# Altium footprint library MinervaBots.PcbLib: 162 footprints (part 4 of 11)
Each footprint in its own frame and in the unit in brackets; x right, y up, seen from the top. Pads: shape width x height; smd on the part's side, far side on the other; paste and mask are expansions set on the pad; w line width, h text height; cw(c..) or ccw(c..) is an arc to the next point about the centre after c.
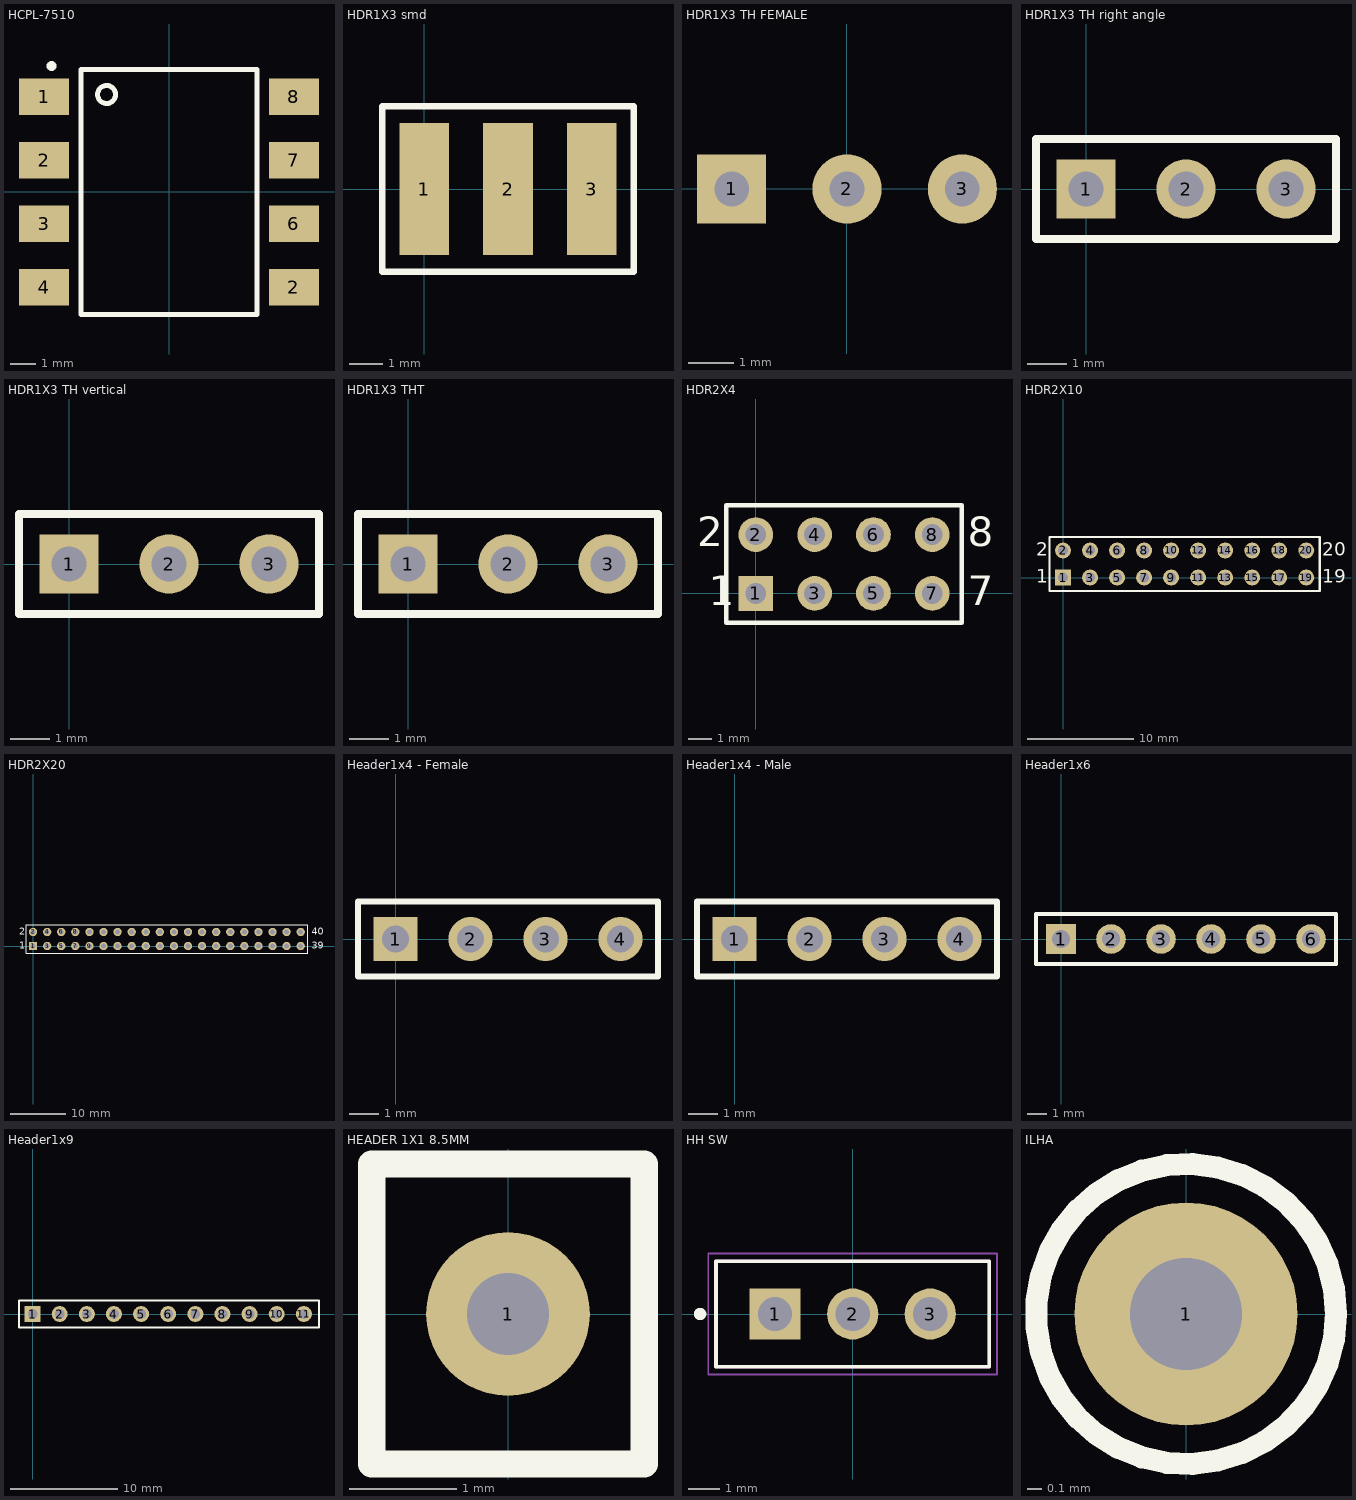
[diagram p3: the footprints below, top view; thin cyan lines are the x and y axes]

## HCPL-7510 [mm]
pads (8):
  rect 2x1.45 smd: 1(-5,3.81) 2(-5,1.27) 2(5,-3.81) 3(-5,-1.27) 4(-5,-3.81) 6(5,-1.27) 7(5,1.27) 8(5,3.81)
Top Overlay:
  circle w0.2: c-2.5,3.9 r0.361
  circle w0.2: c-4.7,5.04 r0.1
  lines w0.2: -3.525,-4.9 3.525,-4.9 3.525,4.9 -3.525,4.9 -3.525,-4.9
Top Designator:
  text ".Designator" at -7.618,-0.388 h1.52
3D body "User Library-SMD-8C.step": height 3.96, standoff -0.04, extent -5.025,-4.897 4.775,4.953

## HDR1X3 smd [mm] "Connector; Header; 3 Position"
pads (3):
  rect 1.5x4 smd: 1(0,0) 2(2.54,0) 3(5.08,0)
Top Overlay:
  lines w0.2: -1.27,-2.5 6.35,-2.5 6.35,2.5 -1.27,2.5 -1.27,-2.5
Top Designator:
  text ".Designator" at -5.117,-3.958 h1.52
3D body "XH-3-SMD-H.stp": height 6, standoff 0, extent -3.725,-9.5 8.725,0.5

## HDR1X3 TH FEMALE [mil]
pads (3):
  rect 60x60 hole 30: 1(-100,0)
  round 60 hole 30: 2(0,0) 3(100,0)
Top Designator:
  text ".Designator" at -299.9,-19.99 h60
3D body "zl305-3s_p2-54_l8-12_w2-5_h5.stp": height 196.85, standoff -118.11, extent -159.84,-49.21 159.84,49.22

## HDR1X3 TH right angle [mm] "Connector; Header; 3 Position"
pads (3):
  rect 1.5x1.5 hole 0.9: 1(0,0)
  round 1.5 hole 0.9: 2(2.54,0) 3(5.08,0)
Top Overlay:
  lines w0.2: -1.27,-1.27 6.35,-1.27 6.35,1.27 -1.27,1.27 -1.27,-1.27
Top Designator:
  text ".Designator" at -5.078,-3.899 h1.52
3D body "User Library-jst-xh-header-rangle.step": height 5.87, standoff -3.27, extent -2.413,-9.144 7.493,2.362

## HDR1X3 TH vertical [mm] "Connector; Header; 3 Position"
pads (3):
  rect 1.5x1.5 hole 0.9: 1(0,0)
  round 1.5 hole 0.9: 2(2.54,0) 3(5.08,0)
Top Overlay:
  lines w0.2: -1.27,-1.27 -1.27,1.27 6.35,1.27 6.35,-1.27 -1.27,-1.27
Top Designator:
  text ".Designator" at -5.078,-0.891 h1.52
3D body "User Library-XH-A-1.step": height 7, standoff -3.4, extent -2.41,-3.433 7.49,2.667

## HDR1X3 THT [mm] "Connector; Header; 3 Position"
pads (3):
  rect 1.5x1.5 hole 0.9: 1(0,0)
  round 1.5 hole 0.9: 2(2.54,0) 3(5.08,0)
Top Overlay:
  lines w0.2: -1.27,-1.27 -1.27,1.27 6.35,1.27 6.35,-1.27 -1.27,-1.27
Top Designator:
  text ".Designator" at -5.078,-0.508 h1.52
3D body "Header 3 pins - Male.stp": height 8.27, standoff -3.27, extent -1.27,-1.24 6.35,1.3

## HDR2X4 [mm] "Connector; Header; 4x2 Position"
pads (8):
  rect 1.5x1.5 hole 0.9: 1(0,0)
  round 1.5 hole 0.9: 2(0,2.54) 3(2.54,0) 4(2.54,2.54) 5(5.08,0) 6(5.08,2.54) 7(7.62,0) 8(7.62,2.54)
Top Overlay:
  lines w0.2: -1.27,-1.27 8.89,-1.27 8.89,3.81 -1.27,3.81 -1.27,-1.27
  text "2" at -2.54,2.032 h1.27
  text "1" at -2.032,-0.508 h1.27
  text "7" at 9.144,-0.508 h1.27
  text "8" at 9.144,2.032 h1.27
Top Designator:
  text ".Designator" at -3.892,0.762 h1.52
3D body "bl_19_219_8.stp": height 11, standoff -10.9, extent -1.26,-1.2 8.9,3.8

## HDR2X10 [mm] "Connector; Header; 10x2 Position"
pads (20):
  rect 1.5x1.5 hole 0.9: 1(0,0)
  round 1.5 hole 0.9: 2(0,2.54) 3(2.54,0) 4(2.54,2.54) 5(5.08,0) 6(5.08,2.54) 7(7.62,0) 8(7.62,2.54) 9(10.16,0) 10(10.16,2.54) 11(12.7,0) 12(12.7,2.54) 13(15.24,0) 14(15.24,2.54) 15(17.78,0) 16(17.78,2.54) 17(20.32,0) 18(20.32,2.54) 19(22.86,0) 20(22.86,2.54)
Top Overlay:
  lines w0.2: -1.27,-1.27 0.635,-1.27 24.13,-1.27 24.13,3.81 0.635,3.81 -1.27,3.81 -1.27,-1.27
  text "20" at 24.384,2.032 h1.27
  text "19" at 24.384,-0.508 h1.27
  text "1" at -2.54,-0.508 h1.27
  text "2" at -2.54,2.032 h1.27
Top Designator:
  text ".Designator" at 4.362,0.762 h1.52
3D body "bl_19_219_20.stp": height 11, standoff -10.9, extent -1.27,-1.3 24.13,3.7

## HDR2X20 [mm] "Connector; Header; 20x2 Position"
pads (40):
  rect 1.5x1.5 hole 0.9: 1(0,0)
  round 1.5 hole 0.9: 2(0,2.54) 3(2.54,0) 4(2.54,2.54) 5(5.08,0) 6(5.08,2.54) 7(7.62,0) 8(7.62,2.54) 9(10.16,0) 10(10.16,2.54) 11(12.7,0) 12(12.7,2.54) 13(15.24,0) 14(15.24,2.54) 15(17.78,0) 16(17.78,2.54) 17(20.32,0) 18(20.32,2.54) 19(22.86,0) 20(22.86,2.54) 21(25.4,0) 22(25.4,2.54) 23(27.94,0) 24(27.94,2.54) 25(30.48,0) 26(30.48,2.54) 27(33.02,0) 28(33.02,2.54) 29(35.56,0) 30(35.56,2.54) 31(38.1,0) 32(38.1,2.54) 33(40.64,0) 34(40.64,2.54) 35(43.18,0) 36(43.18,2.54) 37(45.72,0) 38(45.72,2.54) 39(48.26,0) 40(48.26,2.54)
Top Overlay:
  lines w0.2: -1.27,-1.27 49.53,-1.27 49.53,3.81 -1.27,3.81 -1.27,-1.27
  text "1" at -2.54,-0.508 h1.27
  text "2" at -2.54,2.032 h1.27
  text "40" at 50.292,2.032 h1.27
  text "39" at 50.292,-0.508 h1.27
Top Designator:
  text ".Designator" at 17.316,0.762 h1.52
3D body "25949.stp": height 11, standoff -12.24, extent -1.651,-1.205 49.809,3.745

## Header1x4 - Female [mm] "Connector; Header; 4 Position; Female"
pads (4):
  rect 1.5x1.5 hole 0.9: 1(0,0)
  round 1.5 hole 0.9: 2(2.54,0) 3(5.08,0) 4(7.62,0)
Top Overlay:
  lines w0.2: -1.27,-1.27 -1.27,1.27 8.89,1.27 8.89,-1.27 -1.27,-1.27
Top Designator:
  text ".Designator" at -3.808,-0.508 h1.52
3D body "Header 4 pins - Female.step": height 8.4, standoff -3.15, extent -1.26,-1.2 8.9,1.3

## Header1x4 - Male [mm] "Connector; Header; 4 Position; Male"
pads (4):
  rect 1.5x1.5 hole 0.9: 1(0,0)
  round 1.5 hole 0.9: 2(2.54,0) 3(5.08,0) 4(7.62,0)
Top Overlay:
  lines w0.2: -1.27,-1.27 -1.27,1.27 8.89,1.27 8.89,-1.27 -1.27,-1.27
Top Designator:
  text ".Designator" at -3.808,-0.508 h1.52
3D body "65781.stp": height 8.54, standoff -3, extent -1.23,-1.245 8.93,1.295

## Header1x6 [mm] "Connector; Header; 6 Position"
pads (6):
  rect 1.5x1.5 hole 0.9: 1(0,0)
  round 1.5 hole 0.9: 2(2.54,0) 3(5.08,0) 4(7.62,0) 5(10.16,0) 6(12.7,0)
Top Overlay:
  lines w0.2: -1.27,-1.27 13.97,-1.27 13.97,1.27 -1.27,1.27 -1.27,-1.27
Top Designator:
  text ".Designator" at -1.268,-0.508 h1.52
3D body "65787.stp": height 8.54, standoff -3, extent -1.3,-1.17 13.94,1.37

## Header1x9 [mm] "Connector; Header; 9 Position"
pads (11):
  rect 1.5x1.5 hole 0.9: 1(0,0)
  round 1.5 hole 0.9: 2(2.54,0) 3(5.08,0) 4(7.62,0) 5(10.16,0) 6(12.7,0) 7(15.24,0) 8(17.78,0) 9(20.32,0) 10(22.86,0) 11(25.4,0)
Top Overlay:
  lines w0.2: -1.27,-1.27 -1.27,1.27 26.817,1.27 26.817,-1.27 -1.27,-1.27
3D body "header3.stp": height 9.49, standoff -3.21, extent 19.087,-1.25 26.633,1.251
3D body "header4.stp": height 9.49, standoff -3.21, extent 8.927,-1.251 19.013,1.251
3D body "header4.stp": height 9.49, standoff -3.21, extent -1.233,-1.251 8.853,1.251

## HEADER 1X1 8.5MM [mil] "Stackable 1 pin header"
pads (1):
  round 60 hole 30: 1(0,0)
Top Overlay:
  lines w10: -50,-55 50,-55 50,55 -50,55 -50,-55
Top Designator:
  text ".Designator" at -299.9,-19.99 h60
3D body "PinHead1.STEP": height 335, standoff -145, extent -50,-57.48 50,57.48

## HH SW [mm]
pads (3):
  rect 1.65x1.65 hole 1.1: 1(-2.5,0)
  round 1.65 hole 1.1: 2(0,0) 3(2.5,0)
Top Overlay:
  circle w0.2: c-4.917,0 r0.1
  lines w0.127: -4.4,-1.7 -4.4,1.7 4.4,1.7 4.4,-1.7 -4.4,-1.7
Top Designator:
  text ".Designator" at -7.839,-0.508 h1.52
Mechanical 13:
  circle w0.2: c-2.54,0 r0.1
  lines w0.127: -4.4,-1.7 -4.4,1.7 4.4,1.7 4.4,-1.7 -4.4,-1.7
Mechanical 15:
  lines w0.05: -4.65,-1.95 -4.65,1.95 4.65,1.95 4.65,-1.95 -4.65,-1.95
3D body "SSA12G--3DModel-STEP-56544.STEP": height 5.41, standoff -3, extent -4.394,-1.702 4.394,1.702

## ILHA [mil] "Ilha"
height 270.08
pads (1):
  round 60 hole 30: 1(0,0)
Top Overlay:
  circle w5.91: c0,0 r40.31
Top Designator:
  text ".Designator" at -299.9,-19.99 h60